# Altium footprint library PCBKU.PcbLib: 192 footprints (part 12 of 12)
Each footprint in its own frame and in the unit in brackets; x right, y up, seen from the top. Pads: shape width x height; smd on the part's side, far side on the other; paste and mask are expansions set on the pad; w line width, h text height; cw(c..) or ccw(c..) is an arc to the next point about the centre after c.
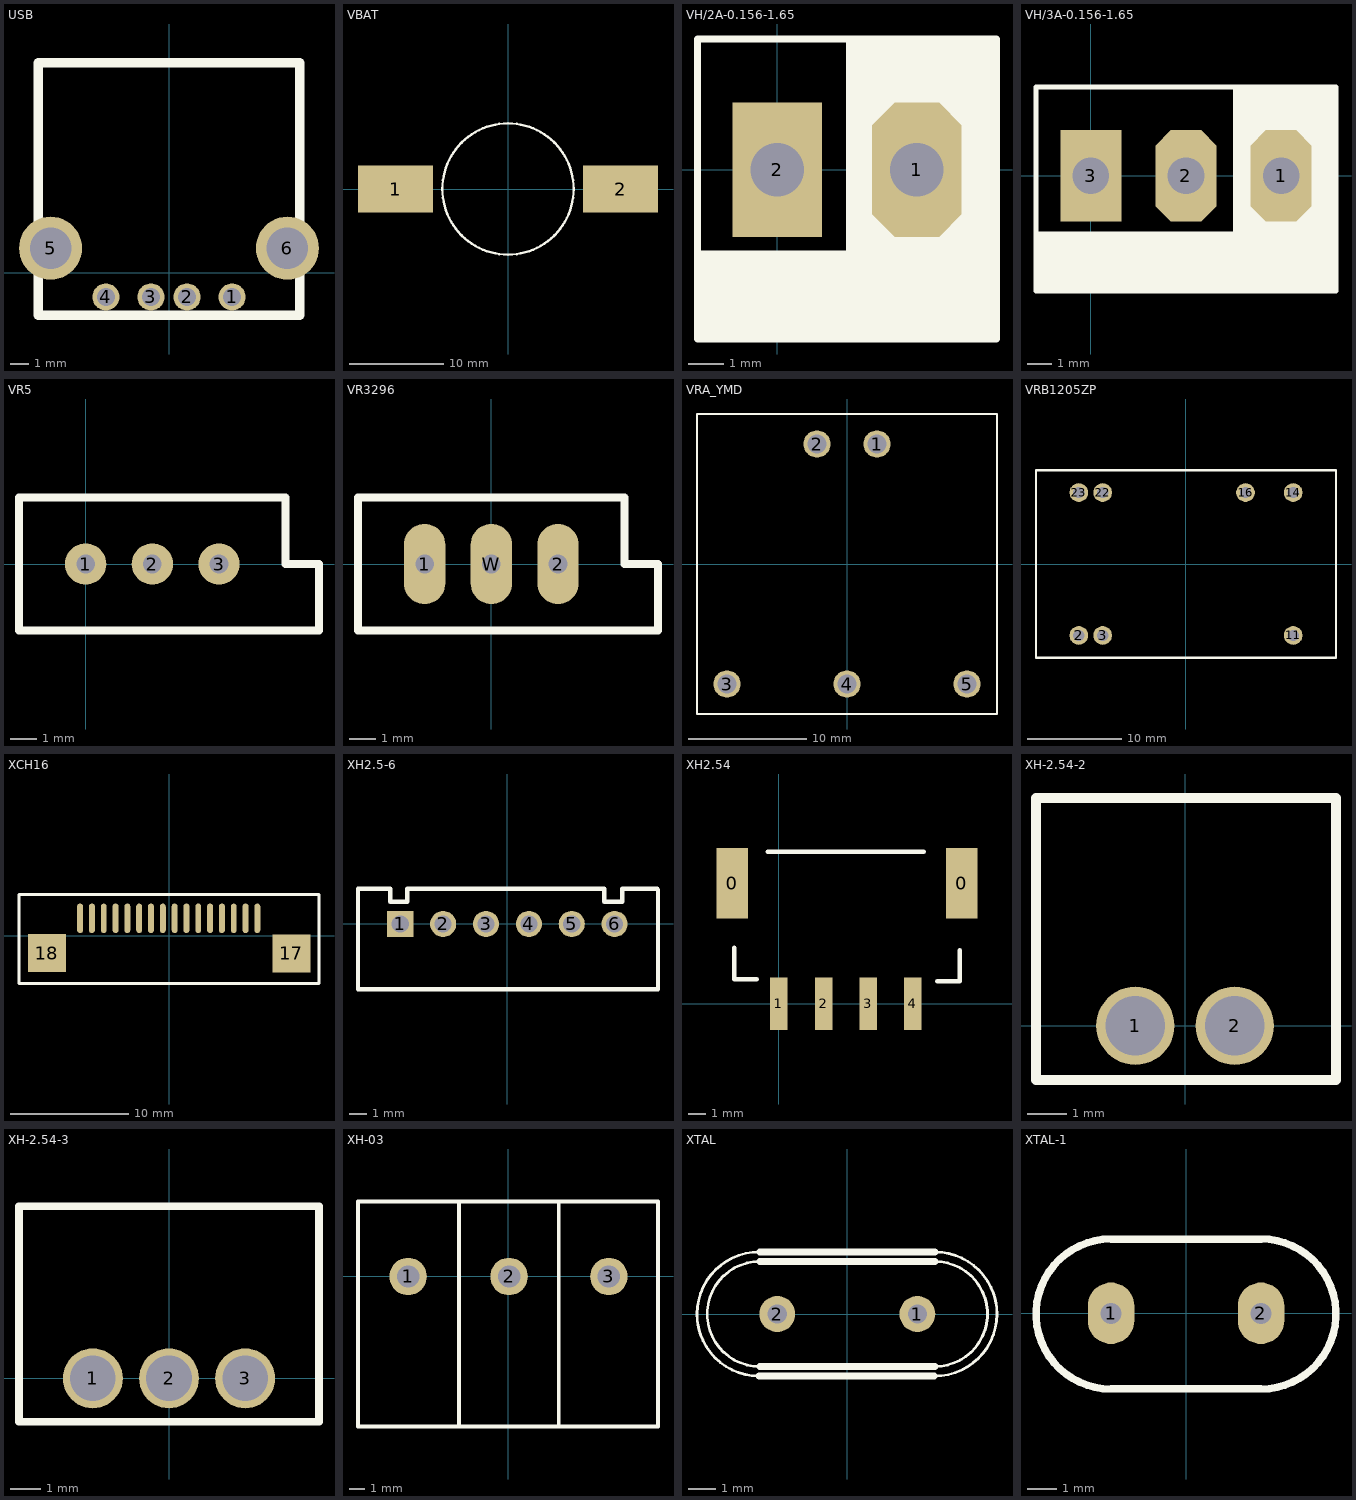
[diagram p11: the footprints below, top view; thin cyan lines are the x and y axes]

## USB [mm]
pads (6):
  round 1.5 hole 1: 1(3.5,-1.355) 2(1,-1.355) 3(-1,-1.355) 4(-3.5,-1.355)
  round 3.5 hole 2.3: 5(-6.57,1.355) 6(6.57,1.355)
Top Overlay:
  lines w0.508: -7.25,-2.365 7.25,-2.365 7.25,11.635 -7.25,11.635 -7.25,-2.365

## VBAT [mm]
pads (2):
  rect 8x5 smd: 1(-12,0) 2(12,0)
Top Overlay:
  circle w0.254: c0,0 r7

## VH/2A-0.156-1.65 [mil]
pads (2):
  oct 100x150 hole 60: 1(155.91,0)
  rect 100x150 hole 60: 2(0,0)
Top Overlay:
  rectangle: 77,-128 242,146
  rectangle: -88,-187 243,-90
  lines w8: 244.95,145 244.95,-189 -89.05,-189 -89.05,146 244.95,146

## VH/3A-0.156-1.65 [mil]
height 43.31
pads (3):
  oct 100x150 hole 60: 1(311.81,0) 2(155.91,0)
  rect 100x150 hole 60: 3(0,0)
Top Overlay:
  rectangle: 232.97,-117.02 400.97,145.98
  rectangle: -88.22,-189.02 401.88,-91.02
  lines w8: -90.16,146 -90.09,-189 401.91,-189 401.97,146 ; -90.09,146 401.91,146

## VR5 [mil]
pads (3):
  round 62 hole 28: 1(0,0) 2(100,0) 3(200,0)
Top Overlay:
  lines w12: -100,-100 -100,100 300,100 300,0 350,0 350,-100 -100,-100

## VR3296 [mil]
pads (3):
  oval 62x120 hole 28: 1(-100,0) 2(100,0) W(0,0)
Top Overlay:
  lines w12: -200,-100 250,-100 250,0 200,0 200,100 -200,100 -200,-100

## VRA_YMD [mm]
pads (5):
  round 2.3 hole 1.6: 1(2.54,10.16) 2(-2.54,10.16) 3(-10.16,-10.16) 4(0,-10.16) 5(10.16,-10.16)
Top Overlay:
  lines w0.203: -12.7,-12.7 -12.7,12.7 12.7,12.7 12.7,-12.7 -12.7,-12.7

## VRB1205ZP [mm]
height 1.1
pads (7):
  round 2 hole 1.2: 2(-11.43,-7.62) 3(-8.89,-7.62) 11(11.43,-7.62) 14(11.43,7.62) 16(6.35,7.62) 22(-8.89,7.62) 23(-11.43,7.62)
Top Overlay:
  lines w0.254: -16,-10 -16,10 16,10 16,-10 -16,-10
3D body: height 10.8, standoff -4.1, extent -16.154,-10.058 15.846,9.942

## XCH16 [mm]
pads (18):
  oval 0.5x2.5 smd: 1(7.458,1.483) 2(6.458,1.483) 3(5.458,1.483) 4(4.458,1.483) 5(3.458,1.483) 6(2.458,1.486) 7(1.458,1.483) 8(0.458,1.483) 9(-0.542,1.483) 10(-1.542,1.483) 11(-2.542,1.483) 12(-3.542,1.483) 13(-4.542,1.483) 14(-5.542,1.483) 15(-6.542,1.483) 16(-7.542,1.483)
  rect 3.2x3.2 smd: 17(10.344,-1.486) 18(-10.344,-1.46)
Top Overlay:
  lines w0.254: -12.712,-4.026 -12.712,3.492 12.676,3.492 12.676,-4.026 -12.712,-4.026

## XH2.5-6 [mm]
pads (6):
  rect 1.524x1.524 hole 1: 1(-6.25,0)
  round 1.524 hole 1: 2(-3.75,0) 3(-1.25,0) 4(1.25,0) 5(3.75,0) 6(6.25,0)
Top Overlay:
  lines w0.254: -5.851,2.042 -5.851,1.295 -6.842,1.295 -6.842,2.042 -8.718,2.042 -8.718,-3.8 8.782,-3.8 8.782,2 ; -5.826,2.042 5.655,2.042 5.655,1.295 6.696,1.295 6.696,2.042 ; 6.722,2.042 8.74,2.042

## XH2.54 [mm]
pads (6):
  rect 1.8x4 smd: 0(-2.667,6.858) 0(10.414,6.858)
  rect 1x3 smd: 1(0,0) 2(2.54,0) 3(5.08,0) 4(7.62,0)
Top Overlay:
  lines w0.254: -2.54,3.175 -2.54,1.397 -1.27,1.397 ; -0.635,8.636 8.255,8.636 ; 9.017,1.27 10.287,1.27 10.287,3.048

## XH-2.54-2 [mm]
pads (2):
  round 2 hole 1.524: 1(-1.27,0) 2(1.27,0)
Top Overlay:
  lines w0.254: -3.81,-1.383 3.86,-1.383 3.86,5.817 -3.81,5.817 -3.81,-1.383

## XH-2.54-3 [mm]
pads (3):
  round 2 hole 1.524: 1(-2.54,0) 2(0,0) 3(2.54,0)
Top Overlay:
  lines w0.254: -5,-1.448 5,-1.448 5,5.74 -5,5.74 -5,-1.448

## XH-03 [mm]
pads (3):
  round 2.5 hole 1.5: 1(-6.693,0) 2(0.038,0) 3(6.693,0)
Top Overlay:
  lines w0.254: -3.302,-10 -3.302,5 ; 3.353,-10 3.353,5 ; -10.033,-10 9.967,-10 9.967,5 -10.033,5 -10.033,-10

## XTAL [mm]
pads (2):
  round 1.3 hole 0.7: 1(2.54,0) 2(-2.54,0)
Top Overlay:
  lines w0.1: -3.2,-2.25 cw(c-3.2,0) -3.177,2.25 ; -3.175,-1.905 cw(c-3.175,0) -3.175,1.905 ; 3.151,-2.25 ccw(c3.175,0) 3.175,2.25 ; 3.175,-1.905 ccw(c3.175,0) 3.175,1.905
  lines w0.25: -3.2,-2.25 3.151,-2.25 ; -3.177,2.25 3.175,2.25 ; -3.175,-1.905 3.175,-1.905 ; -3.175,1.905 3.175,1.905

## XTAL-1 [mil]
pads (2):
  oval 62x82 hole 28: 1(-100,0) 2(100,0)
Top Overlay:
  lines w10: -100,-101 cw(c-100,-1) -100,99 100,99 cw(c100,-1) 100,-101 -100,-101